# Altium footprint library SAMTEC SMD.PcbLib: 165 footprints (part 1 of 17)
Each footprint in its own frame and in the unit in brackets; x right, y up, seen from the top. Pads: shape width x height; smd on the part's side, far side on the other; paste and mask are expansions set on the pad; w line width, h text height; cw(c..) or ccw(c..) is an arc to the next point about the centre after c.
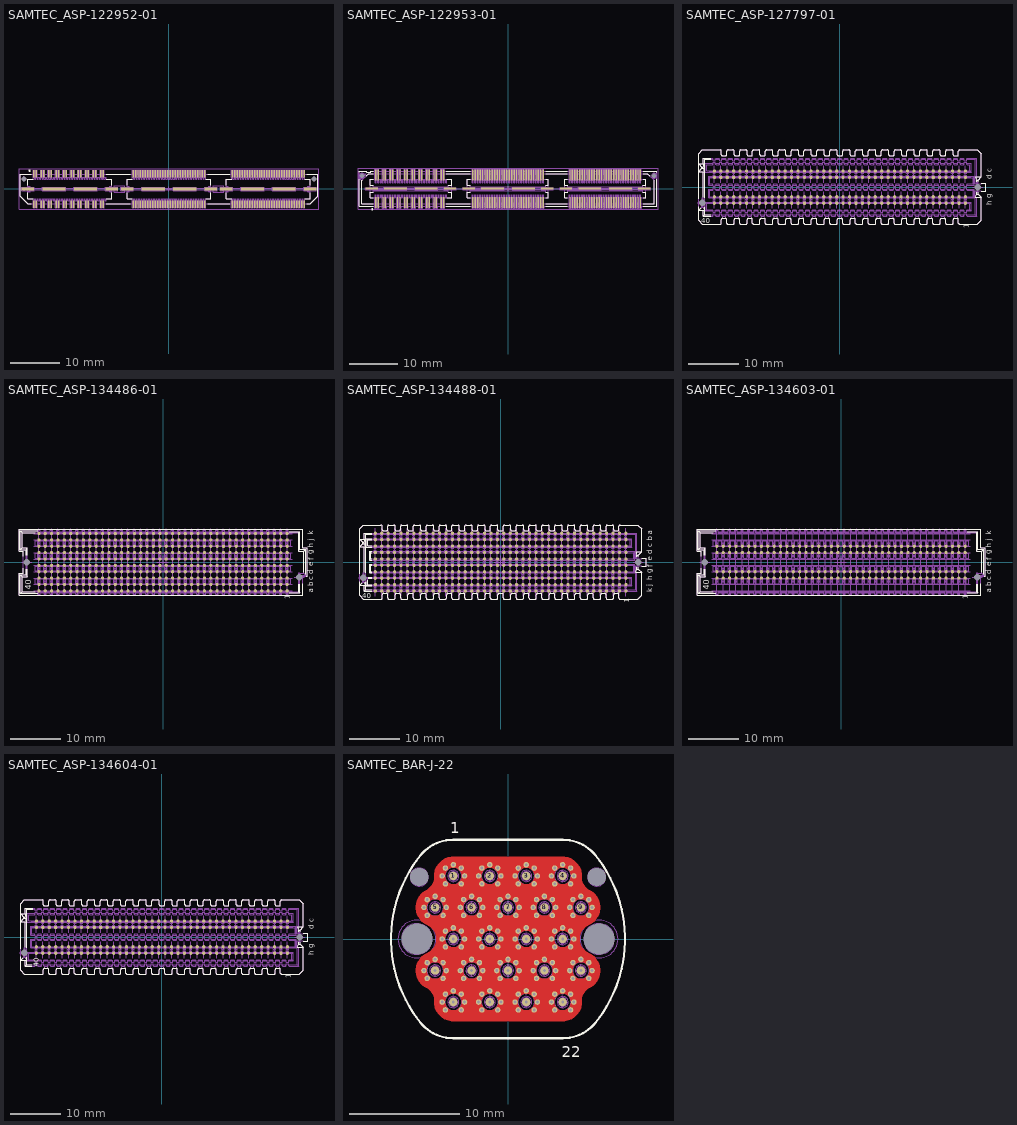
[diagram p0: the footprints below, top view; thin cyan lines are the x and y axes]

## SAMTEC_ASP-122952-01 [mm] "160 Contacts, Pitch 0.5mm, Straight Double Row High Speed Board to Board Header"
height 4.35
pads (174):
  rect 0.3x1.45 smd mask+0: 1(-27.25,3.09) 2(-27.25,-3.09) 3(-26.75,3.09) 4(-26.75,-3.09) 5(-25.75,3.09) 6(-25.75,-3.09) 7(-25.25,3.09) 8(-25.25,-3.09) 9(-24.25,3.09) 10(-24.25,-3.09) 11(-23.75,3.09) 12(-23.75,-3.09) 13(-22.75,3.09) 14(-22.75,-3.09) 15(-22.25,3.09) 16(-22.25,-3.09) 17(-21.25,3.09) 18(-21.25,-3.09) 19(-20.75,3.09) 20(-20.75,-3.09) 21(-19.75,3.09) 22(-19.75,-3.09) 23(-19.25,3.09) 24(-19.25,-3.09) 25(-18.25,3.09) 26(-18.25,-3.09) 27(-17.75,3.09) 28(-17.75,-3.09) 29(-16.75,3.09) 30(-16.75,-3.09) 31(-16.25,3.09) 32(-16.25,-3.09) 33(-15.25,3.09) 34(-15.25,-3.09) 35(-14.75,3.09) 36(-14.75,-3.09) 37(-13.75,3.09) 38(-13.75,-3.09) 39(-13.25,3.09) 40(-13.25,-3.09) 41(-7.25,3.09) 42(-7.25,-3.09) 43(-6.75,3.09) 44(-6.75,-3.09) 45(-6.25,3.09) 46(-6.25,-3.09) 47(-5.75,3.09) 48(-5.75,-3.09) 49(-5.25,3.09) 50(-5.25,-3.09) 51(-4.75,3.09) 52(-4.75,-3.09) 53(-4.25,3.09) 54(-4.25,-3.09) 55(-3.75,3.09) 56(-3.75,-3.09) 57(-3.25,3.09) 58(-3.25,-3.09) 59(-2.75,3.09) 60(-2.75,-3.09) 61(-2.25,3.09) 62(-2.25,-3.09) 63(-1.75,3.09) 64(-1.75,-3.09) 65(-1.25,3.09) 66(-1.25,-3.09) 67(-0.75,3.09) 68(-0.75,-3.09) 69(-0.25,3.09) 70(-0.25,-3.09) 71(0.25,3.09) 72(0.25,-3.09) 73(0.75,3.09) 74(0.75,-3.09) 75(1.25,3.09) 76(1.25,-3.09) 77(1.75,3.09) 78(1.75,-3.09) 79(2.25,3.09) 80(2.25,-3.09) 81(2.75,3.09) 82(2.75,-3.09) 83(3.25,3.09) 84(3.25,-3.09) 85(3.75,3.09) 86(3.75,-3.09) 87(4.25,3.09) 88(4.25,-3.09) 89(4.75,3.09) 90(4.75,-3.09) 91(5.25,3.09) 92(5.25,-3.09) 93(5.75,3.09) 94(5.75,-3.09) 95(6.25,3.09) 96(6.25,-3.09) 97(6.75,3.09) 98(6.75,-3.09) 99(7.25,3.09) 100(7.25,-3.09) 101(12.75,3.09) 102(12.75,-3.09) 103(13.25,3.09) 104(13.25,-3.09) 105(13.75,3.09) 106(13.75,-3.09) 107(14.25,3.09) 108(14.25,-3.09) 109(14.75,3.09) 110(14.75,-3.09) 111(15.25,3.09) 112(15.25,-3.09) 113(15.75,3.09) 114(15.75,-3.09) 115(16.25,3.09) 116(16.25,-3.09) 117(16.75,3.09) 118(16.75,-3.09) 119(17.25,3.09) 120(17.25,-3.09) 121(17.75,3.09) 122(17.75,-3.09) 123(18.25,3.09) 124(18.25,-3.09) 125(18.75,3.09) 126(18.75,-3.09) 127(19.25,3.09) 128(19.25,-3.09) 129(19.75,3.09) 130(19.75,-3.09) 131(20.25,3.09) 132(20.25,-3.09) 133(20.75,3.09) 134(20.75,-3.09) 135(21.25,3.09) 136(21.25,-3.09) 137(21.75,3.09) 138(21.75,-3.09) 139(22.25,3.09) 140(22.25,-3.09) 141(22.75,3.09) 142(22.75,-3.09) 143(23.25,3.09) 144(23.25,-3.09) 145(23.75,3.09) 146(23.75,-3.09) 147(24.25,3.09) 148(24.25,-3.09) 149(24.75,3.09) 150(24.75,-3.09) 151(25.25,3.09) 152(25.25,-3.09) 153(25.75,3.09) 154(25.75,-3.09) 155(26.25,3.09) 156(26.25,-3.09) 157(26.75,3.09) 158(26.75,-3.09) 159(27.25,3.09) 160(27.25,-3.09)
  round 0.5 hole 1 unplated mask+0.25: 161(-29.24,2.03) 162(29.24,2.03)
  rect 2.54x0.64 smd mask+0: 161(-28.445,0) 164(-11.555,0) 165(-8.445,0) 168(8.445,0) 169(11.555,0) 172(28.445,0)
  rect 4.7x0.64 smd mask+0: 162(-23.175,0) 163(-16.825,0) 166(-3.175,0) 167(3.175,0) 170(16.825,0) 171(23.175,0)
Top Overlay:
  circle w0.25: c-28.125,3.7 r0.125
  lines w0.2: -28.441,-0.72 -28.441,-1.968 -27.387,-1.968 ; -28.441,0.72 -28.441,1.968 -27.387,1.968 ; -27.8,-2.984 -28.473,-2.984 -29.996,-1.46 -29.996,2.984 -27.8,2.984 ; -12.7,-2.984 -7.8,-2.984 ; -12.7,2.984 -7.8,2.984 ; -12.608,-1.968 -11.554,-1.968 -11.554,-0.72 ; -12.608,1.968 -11.554,1.968 -11.554,0.72 ; -8.443,-0.72 -8.443,-1.968 -7.39,-1.968 ; -8.443,0.72 -8.443,1.968 -7.39,1.968 ; 7.39,-1.968 8.443,-1.968 8.443,-0.72 ; 7.39,1.968 8.443,1.968 8.443,0.72 ; 7.8,-2.984 12.2,-2.984 ; 7.8,2.984 12.2,2.984 ; 11.554,-0.72 11.554,-1.968 12.608,-1.968 ; 11.554,0.72 11.554,1.968 12.608,1.968 ; 27.387,-1.968 28.441,-1.968 28.441,-0.72 ; 27.387,1.968 28.441,1.968 28.441,0.72 ; 27.8,-2.984 28.473,-2.984 29.996,-1.46 29.996,2.984 27.8,2.984
Mechanical 8:
  drawing of 1043 lines, arcs and shapes, not listed
Mechanical 14:
  drawing of 783 lines, arcs and shapes, not listed
Mechanical 15:
  lines w0.05: -30.246,-4.065 -30.246,4.065 30.246,4.065 30.246,-4.065 -30.246,-4.065
3D body "SAMTEC_ASP-122952-01.stp": height 4.27, standoff -0.75, extent -29.996,-3.555 29.996,3.555

## SAMTEC_ASP-122953-01 [mm] "160 Contacts, Pitch 0.5mm, Straight Double Row High Speed Board to Board Socket"
height 3.32
pads (174):
  round 0.5 hole 1 unplated mask+0.25: 1(-30.074,2.667) 1(30.074,2.667)
  rect 0.27x2.28 smd mask+0: 1(-27.243,-2.862) 3(-26.743,-2.862) 5(-25.743,-2.862) 7(-25.243,-2.862) 9(-24.243,-2.862) 11(-23.743,-2.862) 13(-22.743,-2.862) 15(-22.243,-2.862) 17(-21.243,-2.862) 19(-20.743,-2.862) 21(-19.743,-2.862) 23(-19.243,-2.862) 25(-18.243,-2.862) 27(-17.743,-2.862) 29(-16.743,-2.862) 31(-16.243,-2.862) 33(-15.243,-2.862) 35(-14.743,-2.862) 37(-13.743,-2.862) 39(-13.243,-2.862) 41(-7.248,-2.862) 43(-6.748,-2.862) 45(-6.248,-2.862) 47(-5.748,-2.862) 49(-5.248,-2.862) 51(-4.748,-2.862) 53(-4.248,-2.862) 55(-3.748,-2.862) 57(-3.248,-2.862) 59(-2.748,-2.862) 61(-2.248,-2.862) 63(-1.748,-2.862) 65(-1.248,-2.862) 67(-0.748,-2.862) 69(-0.248,-2.862) 71(0.252,-2.862) 73(0.752,-2.862) 75(1.252,-2.862) 77(1.752,-2.862) 79(2.252,-2.862) 81(2.752,-2.862) 83(3.252,-2.862) 85(3.752,-2.862) 87(4.252,-2.862) 89(4.752,-2.862) 91(5.252,-2.862) 93(5.752,-2.862) 95(6.252,-2.862) 97(6.752,-2.862) 99(7.252,-2.862) 101(12.764,-2.862) 103(13.264,-2.862) 105(13.764,-2.862) 107(14.264,-2.862) 109(14.764,-2.862) 111(15.264,-2.862) 113(15.764,-2.862) 115(16.264,-2.862) 117(16.764,-2.862) 119(17.264,-2.862) 121(17.764,-2.862) 123(18.264,-2.862) 125(18.764,-2.862) 127(19.264,-2.862) 129(19.764,-2.862) 131(20.264,-2.862) 133(20.764,-2.862) 135(21.264,-2.862) 137(21.764,-2.862) 139(22.264,-2.862) 141(22.764,-2.862) 143(23.264,-2.862) 145(23.764,-2.862) 147(24.264,-2.862) 149(24.764,-2.862) 151(25.264,-2.862) 153(25.764,-2.862) 155(26.264,-2.862) 157(26.764,-2.862) 159(27.264,-2.862)
  rect 0.28x2.28 smd mask+0: 2(-27.243,2.862) 4(-26.743,2.862) 6(-25.743,2.862) 8(-25.243,2.862) 10(-24.243,2.862) 12(-23.743,2.862) 14(-22.743,2.862) 16(-22.243,2.862) 18(-21.243,2.862) 20(-20.743,2.862) 22(-19.743,2.862) 24(-19.243,2.862) 26(-18.243,2.862) 28(-17.743,2.862) 30(-16.743,2.862) 32(-16.243,2.862) 34(-15.243,2.862) 36(-14.743,2.862) 38(-13.743,2.862) 40(-13.243,2.862) 42(-7.248,2.862) 44(-6.748,2.862) 46(-6.248,2.862) 48(-5.748,2.862) 50(-5.248,2.862) 52(-4.748,2.862) 54(-4.248,2.862) 56(-3.748,2.862) 58(-3.248,2.862) 60(-2.748,2.862) 62(-2.248,2.862) 64(-1.748,2.862) 66(-1.248,2.862) 68(-0.748,2.862) 70(-0.248,2.862) 72(0.252,2.862) 74(0.752,2.862) 76(1.252,2.862) 78(1.752,2.862) 80(2.252,2.862) 82(2.752,2.862) 84(3.252,2.862) 86(3.752,2.862) 88(4.252,2.862) 90(4.752,2.862) 92(5.252,2.862) 94(5.752,2.862) 96(6.252,2.862) 98(6.752,2.862) 100(7.252,2.862) 102(12.764,2.862) 104(13.264,2.862) 106(13.764,2.862) 108(14.264,2.862) 110(14.764,2.862) 112(15.264,2.862) 114(15.764,2.862) 116(16.264,2.862) 118(16.764,2.862) 120(17.264,2.862) 122(17.764,2.862) 124(18.264,2.862) 126(18.764,2.862) 128(19.264,2.862) 130(19.764,2.862) 132(20.264,2.862) 134(20.764,2.862) 136(21.264,2.862) 138(21.764,2.862) 140(22.264,2.862) 142(22.764,2.862) 144(23.264,2.862) 146(23.764,2.862) 148(24.264,2.862) 150(24.764,2.862) 152(25.264,2.862) 154(25.764,2.862) 156(26.264,2.862) 158(26.764,2.862) 160(27.264,2.862)
  rect 2.54x0.43 smd mask+0: 161(-28.078,0) 164(-11.949,0) 165(-8.063,0) 168(8.066,0) 169(11.949,0) 172(28.078,0)
  rect 4.7x0.43 smd mask+0: 162(-23.189,0) 163(-16.839,0) 166(-3.173,0) 167(3.177,0) 170(16.839,0) 171(23.189,0)
Top Overlay:
  circle w0.25: c-27.925,-4.247 r0.125
  lines w0.2: -30.631,1.96 -30.631,-3.619 -27.783,-3.619 ; -30.631,3.374 -30.631,3.619 -29.107,3.619 -29.107,3.365 -28.219,3.365 -28.219,3.619 -27.783,3.619 ; -30.031,1.768 -30.085,1.714 -30.085,-3.111 -27.783,-3.111 ; -29.175,2.625 -28.688,3.111 -27.783,3.111 ; -27.783,-1.905 -28.314,-1.905 -28.314,-0.698 -27.743,-0.698 ; -27.783,1.905 -28.314,1.905 -28.314,0.698 -27.743,0.698 ; -12.703,-3.619 -7.788,-3.619 ; -12.703,-3.111 -7.788,-3.111 ; -12.703,3.111 -7.788,3.111 ; -12.703,3.619 -7.788,3.619 ; -12.646,-1.905 -11.573,-1.905 -11.573,-0.698 -12.252,-0.698 ; -12.646,1.905 -11.573,1.905 -11.573,0.698 -12.252,0.698 ; -7.788,-1.905 -8.424,-1.905 -8.424,-0.698 -7.745,-0.698 ; -7.788,1.905 -8.424,1.905 -8.424,0.698 -7.745,0.698 ; 7.745,-0.698 8.297,-0.698 8.297,-1.905 7.792,-1.905 ; 7.745,0.698 8.297,0.698 8.297,1.905 7.792,1.905 ; 7.792,-3.619 12.224,-3.619 ; 7.792,-3.111 12.224,-3.111 ; 7.792,3.111 12.224,3.111 ; 7.792,3.619 12.224,3.619 ; 11.7,-0.698 12.252,-0.698 ; 11.7,0.698 12.252,0.698 ; 11.701,-0.698 11.7,-1.905 12.224,-1.905 ; 11.702,0.698 11.704,1.901 12.224,1.903 ; 27.743,-0.698 28.313,-0.698 28.313,-1.905 27.804,-1.905 ; 27.743,0.698 28.313,0.698 28.313,1.905 27.804,1.905 ; 27.804,-3.619 30.631,-3.619 30.631,1.96 ; 27.804,-3.111 30.085,-3.111 30.085,1.714 30.031,1.768 ; 27.804,3.111 28.688,3.111 29.175,2.625 ; 27.804,3.619 30.631,3.619 30.631,3.374
Mechanical 8:
  drawing of 1047 lines, arcs and shapes, not listed
Mechanical 14:
  drawing of 833 lines, arcs and shapes, not listed
Mechanical 15:
  lines w0.05: -30.881,-4.247 -30.881,4.247 30.881,4.247 30.881,-4.247 -30.881,-4.247
3D body "SAMTEC_ASP-122953-01.stp": height 3.25, standoff -0.75, extent -30.631,-3.745 30.631,3.746

## SAMTEC_ASP-127797-01 [mm] "Connector VITA 57, 160 Male contacts in 4 row cdgh"
height 6.1
pads (162):
  round 0.5 hole 1.3 unplated mask+0.4: 1(-27.191,-3.048) 2(27.191,0)
  round 0.64 smd paste+0.125: c1(24.765,3.175) c2(23.495,3.175) c3(22.225,3.175) c4(20.955,3.175) c5(19.685,3.175) c6(18.415,3.175) c7(17.145,3.175) c8(15.875,3.175) c9(14.605,3.175) c10(13.335,3.175) c11(12.065,3.175) c12(10.795,3.175) c13(9.525,3.175) c14(8.255,3.175) c15(6.985,3.175) c16(5.715,3.175) c17(4.445,3.175) c18(3.175,3.175) c19(1.905,3.175) c20(0.635,3.175) c21(-0.635,3.175) c22(-1.905,3.175) c23(-3.175,3.175) c24(-4.445,3.175) c25(-5.715,3.175) c26(-6.985,3.175) c27(-8.255,3.175) c28(-9.525,3.175) c29(-10.795,3.175) c30(-12.065,3.175) c31(-13.335,3.175) c32(-14.605,3.175) c33(-15.875,3.175) c34(-17.145,3.175) c35(-18.415,3.175) c36(-19.685,3.175) c37(-20.955,3.175) c38(-22.225,3.175) c39(-23.495,3.175) c40(-24.765,3.175) d1(24.765,1.905) d2(23.495,1.905) d3(22.225,1.905) d4(20.955,1.905) d5(19.685,1.905) d6(18.415,1.905) d7(17.145,1.905) d8(15.875,1.905) d9(14.605,1.905) d10(13.335,1.905) d11(12.065,1.905) d12(10.795,1.905) d13(9.525,1.905) d14(8.255,1.905) d15(6.985,1.905) d16(5.715,1.905) d17(4.445,1.905) d18(3.175,1.905) d19(1.905,1.905) d20(0.635,1.905) d21(-0.635,1.905) d22(-1.905,1.905) d23(-3.175,1.905) d24(-4.445,1.905) d25(-5.715,1.905) d26(-6.985,1.905) d27(-8.255,1.905) d28(-9.525,1.905) d29(-10.795,1.905) d30(-12.065,1.905) d31(-13.335,1.905) d32(-14.605,1.905) d33(-15.875,1.905) d34(-17.145,1.905) d35(-18.415,1.905) d36(-19.685,1.905) d37(-20.955,1.905) d38(-22.225,1.905) d39(-23.495,1.905) d40(-24.765,1.905) g1(24.765,-1.905) g2(23.495,-1.905) g3(22.225,-1.905) g4(20.955,-1.905) g5(19.685,-1.905) g6(18.415,-1.905) g7(17.145,-1.905) g8(15.875,-1.905) g9(14.605,-1.905) g10(13.335,-1.905) g11(12.065,-1.905) g12(10.795,-1.905) g13(9.525,-1.905) g14(8.255,-1.905) g15(6.985,-1.905) g16(5.715,-1.905) g17(4.445,-1.905) g18(3.175,-1.905) g19(1.905,-1.905) g20(0.635,-1.905) g21(-0.635,-1.905) g22(-1.905,-1.905) g23(-3.175,-1.905) g24(-4.445,-1.905) g25(-5.715,-1.905) g26(-6.985,-1.905) g27(-8.255,-1.905) g28(-9.525,-1.905) g29(-10.795,-1.905) g30(-12.065,-1.905) g31(-13.335,-1.905) g32(-14.605,-1.905) g33(-15.875,-1.905) g34(-17.145,-1.905) g35(-18.415,-1.905) g36(-19.685,-1.905) g37(-20.955,-1.905) g38(-22.225,-1.905) g39(-23.495,-1.905) g40(-24.765,-1.905) h1(24.765,-3.175) h2(23.495,-3.175) h3(22.225,-3.175) h4(20.955,-3.175) h5(19.685,-3.175) h6(18.415,-3.175) h7(17.145,-3.175) h8(15.875,-3.175) h9(14.605,-3.175) h10(13.335,-3.175) h11(12.065,-3.175) h12(10.795,-3.175) h13(9.525,-3.175) h14(8.255,-3.175) h15(6.985,-3.175) h16(5.715,-3.175) h17(4.445,-3.175) h18(3.175,-3.175) h19(1.905,-3.175) h20(0.635,-3.175) h21(-0.635,-3.175) h22(-1.905,-3.175) h23(-3.175,-3.175) h24(-4.445,-3.175) h25(-5.715,-3.175) h26(-6.985,-3.175) h27(-8.255,-3.175) h28(-9.525,-3.175) h29(-10.795,-3.175) h30(-12.065,-3.175) h31(-13.335,-3.175) h32(-14.605,-3.175) h33(-15.875,-3.175) h34(-17.145,-3.175) h35(-18.415,-3.175) h36(-19.685,-3.175) h37(-20.955,-3.175) h38(-22.225,-3.175) h39(-23.495,-3.175) h40(-24.765,-3.175)
Top Overlay:
  drawing of 605 lines, arcs and shapes, not listed
  text "d" at 29.989,1.545 h1
  text "c" at 29.972,2.921 h1
  text "h" at 29.972,-3.556 h1
  text "g" at 29.862,-2.231 h1
  text "40" at -27.305,-7.112 h1
  text "1" at 25.417,-8.073 h1
Mechanical 8:
  drawing of 648 lines, arcs and shapes, not listed
Mechanical 14:
  drawing of 4433 lines, arcs and shapes, not listed
  text "c" at 29.972,2.921 h1
  text "d" at 29.989,1.545 h1
  text "h" at 29.972,-3.556 h1
  text "g" at 29.862,-2.231 h1
  text "40" at -27.305,-7.112 h1
  text "1" at 25.417,-8.073 h1
3D body "SAMTEC_ASP-127797-01.stp": height 5.61, standoff -1.27, extent -27.889,-7.341 28.778,7.341

## SAMTEC_ASP-134486-01 [mm] "Connector VITA 57, 400 Female contacts in 10 row abcdefghj"
height 6.55
pads (402):
  round 0.5 hole 1.3 unplated mask+0.4: 1(-27.19,0) 2(27.19,-3.05)
  round 0.64 smd paste+0.125: a1(24.765,-5.715) a2(23.495,-5.715) a3(22.225,-5.715) a4(20.955,-5.715) a5(19.685,-5.715) a6(18.415,-5.715) a7(17.145,-5.715) a8(15.875,-5.715) a9(14.605,-5.715) a10(13.335,-5.715) a11(12.065,-5.715) a12(10.795,-5.715) a13(9.525,-5.715) a14(8.255,-5.715) a15(6.985,-5.715) a16(5.715,-5.715) a17(4.445,-5.715) a18(3.175,-5.715) a19(1.905,-5.715) a20(0.635,-5.715) a21(-0.635,-5.715) a22(-1.905,-5.715) a23(-3.175,-5.715) a24(-4.445,-5.715) a25(-5.715,-5.715) a26(-6.985,-5.715) a27(-8.255,-5.715) a28(-9.525,-5.715) a29(-10.795,-5.715) a30(-12.065,-5.715) a31(-13.335,-5.715) a32(-14.605,-5.715) a33(-15.875,-5.715) a34(-17.145,-5.715) a35(-18.415,-5.715) a36(-19.685,-5.715) a37(-20.955,-5.715) a38(-22.225,-5.715) a39(-23.495,-5.715) a40(-24.765,-5.715) b1(24.765,-4.445) b2(23.495,-4.445) b3(22.225,-4.445) b4(20.955,-4.445) b5(19.685,-4.445) b6(18.415,-4.445) b7(17.145,-4.445) b8(15.875,-4.445) b9(14.605,-4.445) b10(13.335,-4.445) b11(12.065,-4.445) b12(10.795,-4.445) b13(9.525,-4.445) b14(8.255,-4.445) b15(6.985,-4.445) b16(5.715,-4.445) b17(4.445,-4.445) b18(3.175,-4.445) b19(1.905,-4.445) b20(0.635,-4.445) b21(-0.635,-4.445) b22(-1.905,-4.445) b23(-3.175,-4.445) b24(-4.445,-4.445) b25(-5.715,-4.445) b26(-6.985,-4.445) b27(-8.255,-4.445) b28(-9.525,-4.445) b29(-10.795,-4.445) b30(-12.065,-4.445) b31(-13.335,-4.445) b32(-14.605,-4.445) b33(-15.875,-4.445) b34(-17.145,-4.445) b35(-18.415,-4.445) b36(-19.685,-4.445) b37(-20.955,-4.445) b38(-22.225,-4.445) b39(-23.495,-4.445) b40(-24.765,-4.445) c1(24.765,-3.175) c2(23.495,-3.175) c3(22.225,-3.175) c4(20.955,-3.175) c5(19.685,-3.175) c6(18.415,-3.175) c7(17.145,-3.175) c8(15.875,-3.175) c9(14.605,-3.175) c10(13.335,-3.175) c11(12.065,-3.175) c12(10.795,-3.175) c13(9.525,-3.175) c14(8.255,-3.175) c15(6.985,-3.175) c16(5.715,-3.175) c17(4.445,-3.175) c18(3.175,-3.175) c19(1.905,-3.175) c20(0.635,-3.175) c21(-0.635,-3.175) c22(-1.905,-3.175) c23(-3.175,-3.175) c24(-4.445,-3.175) c25(-5.715,-3.175) c26(-6.985,-3.175) c27(-8.255,-3.175) c28(-9.525,-3.175) c29(-10.795,-3.175) c30(-12.065,-3.175) c31(-13.335,-3.175) c32(-14.605,-3.175) c33(-15.875,-3.175) c34(-17.145,-3.175) c35(-18.415,-3.175) c36(-19.685,-3.175) c37(-20.955,-3.175) c38(-22.225,-3.175) c39(-23.495,-3.175) c40(-24.765,-3.175) d1(24.765,-1.905) d2(23.495,-1.905) d3(22.225,-1.905) d4(20.955,-1.905) d5(19.685,-1.905) d6(18.415,-1.905) d7(17.145,-1.905) d8(15.875,-1.905) d9(14.605,-1.905) d10(13.335,-1.905) d11(12.065,-1.905) d12(10.795,-1.905) d13(9.525,-1.905) d14(8.255,-1.905) d15(6.985,-1.905) d16(5.715,-1.905) d17(4.445,-1.905) d18(3.175,-1.905) d19(1.905,-1.905) d20(0.635,-1.905) d21(-0.635,-1.905) d22(-1.905,-1.905) d23(-3.175,-1.905) d24(-4.445,-1.905) d25(-5.715,-1.905) d26(-6.985,-1.905) d27(-8.255,-1.905) d28(-9.525,-1.905) d29(-10.795,-1.905) d30(-12.065,-1.905) d31(-13.335,-1.905) d32(-14.605,-1.905) d33(-15.875,-1.905) d34(-17.145,-1.905) d35(-18.415,-1.905) d36(-19.685,-1.905) d37(-20.955,-1.905) d38(-22.225,-1.905) d39(-23.495,-1.905) d40(-24.765,-1.905) e1(24.765,-0.635) e2(23.495,-0.635) e3(22.225,-0.635) e4(20.955,-0.635) e5(19.685,-0.635) e6(18.415,-0.635) e7(17.145,-0.635) e8(15.875,-0.635) e9(14.605,-0.635) e10(13.335,-0.635) e11(12.065,-0.635) e12(10.795,-0.635) e13(9.525,-0.635) e14(8.255,-0.635) e15(6.985,-0.635) e16(5.715,-0.635) e17(4.445,-0.635) e18(3.175,-0.635) e19(1.905,-0.635) e20(0.635,-0.635) e21(-0.635,-0.635) e22(-1.905,-0.635) e23(-3.175,-0.635) e24(-4.445,-0.635) e25(-5.715,-0.635) e26(-6.985,-0.635) e27(-8.255,-0.635) e28(-9.525,-0.635) e29(-10.795,-0.635) e30(-12.065,-0.635) e31(-13.335,-0.635) e32(-14.605,-0.635) e33(-15.875,-0.635) e34(-17.145,-0.635) e35(-18.415,-0.635) e36(-19.685,-0.635) e37(-20.955,-0.635) e38(-22.225,-0.635) e39(-23.495,-0.635) e40(-24.765,-0.635) f1(24.765,0.635) f2(23.495,0.635) f3(22.225,0.635) f4(20.955,0.635) f5(19.685,0.635) f6(18.415,0.635) f7(17.145,0.635) f8(15.875,0.635) f9(14.605,0.635) f10(13.335,0.635) f11(12.065,0.635) f12(10.795,0.635) f13(9.525,0.635) f14(8.255,0.635) f15(6.985,0.635) f16(5.715,0.635) f17(4.445,0.635) f18(3.175,0.635) f19(1.905,0.635) f20(0.635,0.635) f21(-0.635,0.635) f22(-1.905,0.635) f23(-3.175,0.635) f24(-4.445,0.635) f25(-5.715,0.635) f26(-6.985,0.635) f27(-8.255,0.635) f28(-9.525,0.635) f29(-10.795,0.635) f30(-12.065,0.635) f31(-13.335,0.635) f32(-14.605,0.635) f33(-15.875,0.635) f34(-17.145,0.635) f35(-18.415,0.635) f36(-19.685,0.635) f37(-20.955,0.635) f38(-22.225,0.635) f39(-23.495,0.635) f40(-24.765,0.635) g1(24.765,1.905) g2(23.495,1.905) g3(22.225,1.905) g4(20.955,1.905) g5(19.685,1.905) g6(18.415,1.905) g7(17.145,1.905) g8(15.875,1.905) g9(14.605,1.905) g10(13.335,1.905) g11(12.065,1.905) g12(10.795,1.905) g13(9.525,1.905) g14(8.255,1.905) g15(6.985,1.905) g16(5.715,1.905) g17(4.445,1.905) g18(3.175,1.905) g19(1.905,1.905) g20(0.635,1.905) g21(-0.635,1.905) g22(-1.905,1.905) g23(-3.175,1.905) g24(-4.445,1.905) g25(-5.715,1.905) g26(-6.985,1.905) g27(-8.255,1.905) g28(-9.525,1.905) g29(-10.795,1.905) g30(-12.065,1.905) g31(-13.335,1.905) g32(-14.605,1.905) g33(-15.875,1.905) g34(-17.145,1.905) g35(-18.415,1.905) g36(-19.685,1.905) g37(-20.955,1.905) g38(-22.225,1.905) g39(-23.495,1.905) g40(-24.765,1.905) h1(24.765,3.175) h2(23.495,3.175) h3(22.225,3.175) h4(20.955,3.175) h5(19.685,3.175) h6(18.415,3.175) h7(17.145,3.175) h8(15.875,3.175) h9(14.605,3.175) h10(13.335,3.175) h11(12.065,3.175) h12(10.795,3.175) h13(9.525,3.175) h14(8.255,3.175) h15(6.985,3.175) h16(5.715,3.175) h17(4.445,3.175) h18(3.175,3.175) h19(1.905,3.175) h20(0.635,3.175) h21(-0.635,3.175) h22(-1.905,3.175) h23(-3.175,3.175) h24(-4.445,3.175) h25(-5.715,3.175) h26(-6.985,3.175) h27(-8.255,3.175) h28(-9.525,3.175) h29(-10.795,3.175) h30(-12.065,3.175) h31(-13.335,3.175) h32(-14.605,3.175) h33(-15.875,3.175) h34(-17.145,3.175) h35(-18.415,3.175) h36(-19.685,3.175) h37(-20.955,3.175) h38(-22.225,3.175) h39(-23.495,3.175) h40(-24.765,3.175) j1(24.765,4.445) j2(23.495,4.445) j3(22.225,4.445) j4(20.955,4.445) j5(19.685,4.445) j6(18.415,4.445) j7(17.145,4.445) j8(15.875,4.445) j9(14.605,4.445) j10(13.335,4.445) j11(12.065,4.445) j12(10.795,4.445) j13(9.525,4.445) j14(8.255,4.445) j15(6.985,4.445) j16(5.715,4.445) j17(4.445,4.445) j18(3.175,4.445) j19(1.905,4.445) j20(0.635,4.445) j21(-0.635,4.445) j22(-1.905,4.445) j23(-3.175,4.445) j24(-4.445,4.445) j25(-5.715,4.445) j26(-6.985,4.445) j27(-8.255,4.445) j28(-9.525,4.445) j29(-10.795,4.445) j30(-12.065,4.445) j31(-13.335,4.445) j32(-14.605,4.445) j33(-15.875,4.445) j34(-17.145,4.445) j35(-18.415,4.445) j36(-19.685,4.445) j37(-20.955,4.445) j38(-22.225,4.445) j39(-23.495,4.445) j40(-24.765,4.445) k1(24.765,5.715) k2(23.495,5.715) k3(22.225,5.715) k4(20.955,5.715) k5(19.685,5.715) k6(18.415,5.715) k7(17.145,5.715) k8(15.875,5.715) k9(14.605,5.715) k10(13.335,5.715) k11(12.065,5.715) k12(10.795,5.715) k13(9.525,5.715) k14(8.255,5.715) k15(6.985,5.715) k16(5.715,5.715) k17(4.445,5.715) k18(3.175,5.715) k19(1.905,5.715) k20(0.635,5.715) k21(-0.635,5.715) k22(-1.905,5.715) k23(-3.175,5.715) k24(-4.445,5.715) k25(-5.715,5.715) k26(-6.985,5.715) k27(-8.255,5.715) k28(-9.525,5.715) k29(-10.795,5.715) k30(-12.065,5.715) k31(-13.335,5.715) k32(-14.605,5.715) k33(-15.875,5.715) k34(-17.145,5.715) k35(-18.415,5.715) k36(-19.685,5.715) k37(-20.955,5.715) k38(-22.225,5.715) k39(-23.495,5.715) k40(-24.765,5.715)
Top Overlay:
  lines w0.2: -27.889,-1.213 -27.889,-2.197 -28.727,-2.197 -28.727,-6.617 27.889,-6.617 27.889,-4.263 ; -27.889,1.213 -27.889,2.197 -28.727,2.197 -28.727,6.617 27.889,6.617 27.889,2.845 28.727,2.845 28.727,-2.845 28.575,-2.845 ; -27.305,-1.395 -27.305,-2.477 ; -27.305,1.395 -27.305,2.476 ; -27.051,-1.393 -27.051,-2.858 ; -27.051,1.393 -27.051,2.857 ; -25.5,-5.855 -28.067,-5.855 ; -25.5,5.855 -28.067,5.855 ; -24.994,-6.236 -28.448,-6.236 ; -24.994,6.236 -28.448,6.236 ; 25.2,-6.109 27.305,-6.109 ; 25.2,6.109 27.305,6.109 ; 27.051,-4.443 27.051,-5.855 27.305,-6.109 ; 27.305,-4.445 27.305,-6.109 ; 28.067,-1.959 28.067,2.184 ; 28.448,-2.436 28.448,2.565 ; -28.448,-6.236 -28.448,-2.477 ; -28.448,-6.236 -28.067,-5.855 ; -28.448,-2.477 -27.305,-2.477 ; -28.448,-2.477 -28.067,-2.858 ; -28.448,2.476 -28.448,6.236 ; -28.448,2.476 -27.305,2.476 ; -28.448,2.476 -28.067,2.857 ; -28.448,6.236 -28.067,5.855 ; -28.067,-5.855 -28.067,-2.858 ; -28.067,-2.858 -27.051,-2.858 ; -28.067,2.857 -27.051,2.857 ; -28.067,2.857 -28.067,5.855 ; -27.305,-2.477 -27.051,-2.858 ; -27.305,2.476 -27.051,2.857 ; 27.051,2.184 27.051,5.855 27.305,6.109 ; 27.051,2.184 28.067,2.184 ; 27.051,2.184 27.305,2.565 ; 27.305,2.565 28.448,2.565 ; 27.305,2.565 27.305,6.109 ; 28.067,2.184 28.448,2.565
  text "e" at 29.949,-0.836 h1
  text "d" at 29.989,-2.392 h1
  text "c" at 29.972,-3.556 h1
  text "b" at 29.972,-4.826 h1
  text "a" at 29.972,-6.096 h1
  text "f" at 30.116,0.436 h1
  text "h" at 29.972,2.921 h1
  text "g" at 29.862,1.579 h1
  text "j" at 29.989,4.246 h1
  text "k" at 29.989,5.516 h1
  text "40" at -26.289,-5.461 h1.2
  text "1" at 25.29,-7.438 h1
Mechanical 8:
  drawing of 1618 lines, arcs and shapes, not listed
Mechanical 14:
  drawing of 1424 lines, arcs and shapes, not listed
  text "a" at 29.972,-6.096 h1
  text "b" at 29.972,-4.826 h1
  text "c" at 29.972,-3.556 h1
  text "d" at 29.989,-2.392 h1
  text "e" at 29.949,-0.836 h1
  text "f" at 30.116,0.436 h1
  text "h" at 29.972,2.921 h1
  text "g" at 29.862,1.579 h1
  text "j" at 29.989,4.246 h1
  text "k" at 29.989,5.516 h1
  text "40" at -26.289,-5.461 h1.2
  text "1" at 25.29,-7.438 h1
3D body "SAMTEC_ASP-134486-01.stp": height 6.55, standoff -1.27, extent -28.727,-6.618 28.727,6.618